# Altium footprint library MOLEX THD.PcbLib: 57 footprints (part 2 of 4)
Each footprint in its own frame and in the unit in brackets; x right, y up, seen from the top. Pads: shape width x height; smd on the part's side, far side on the other; paste and mask are expansions set on the pad; w line width, h text height; cw(c..) or ccw(c..) is an arc to the next point about the centre after c.
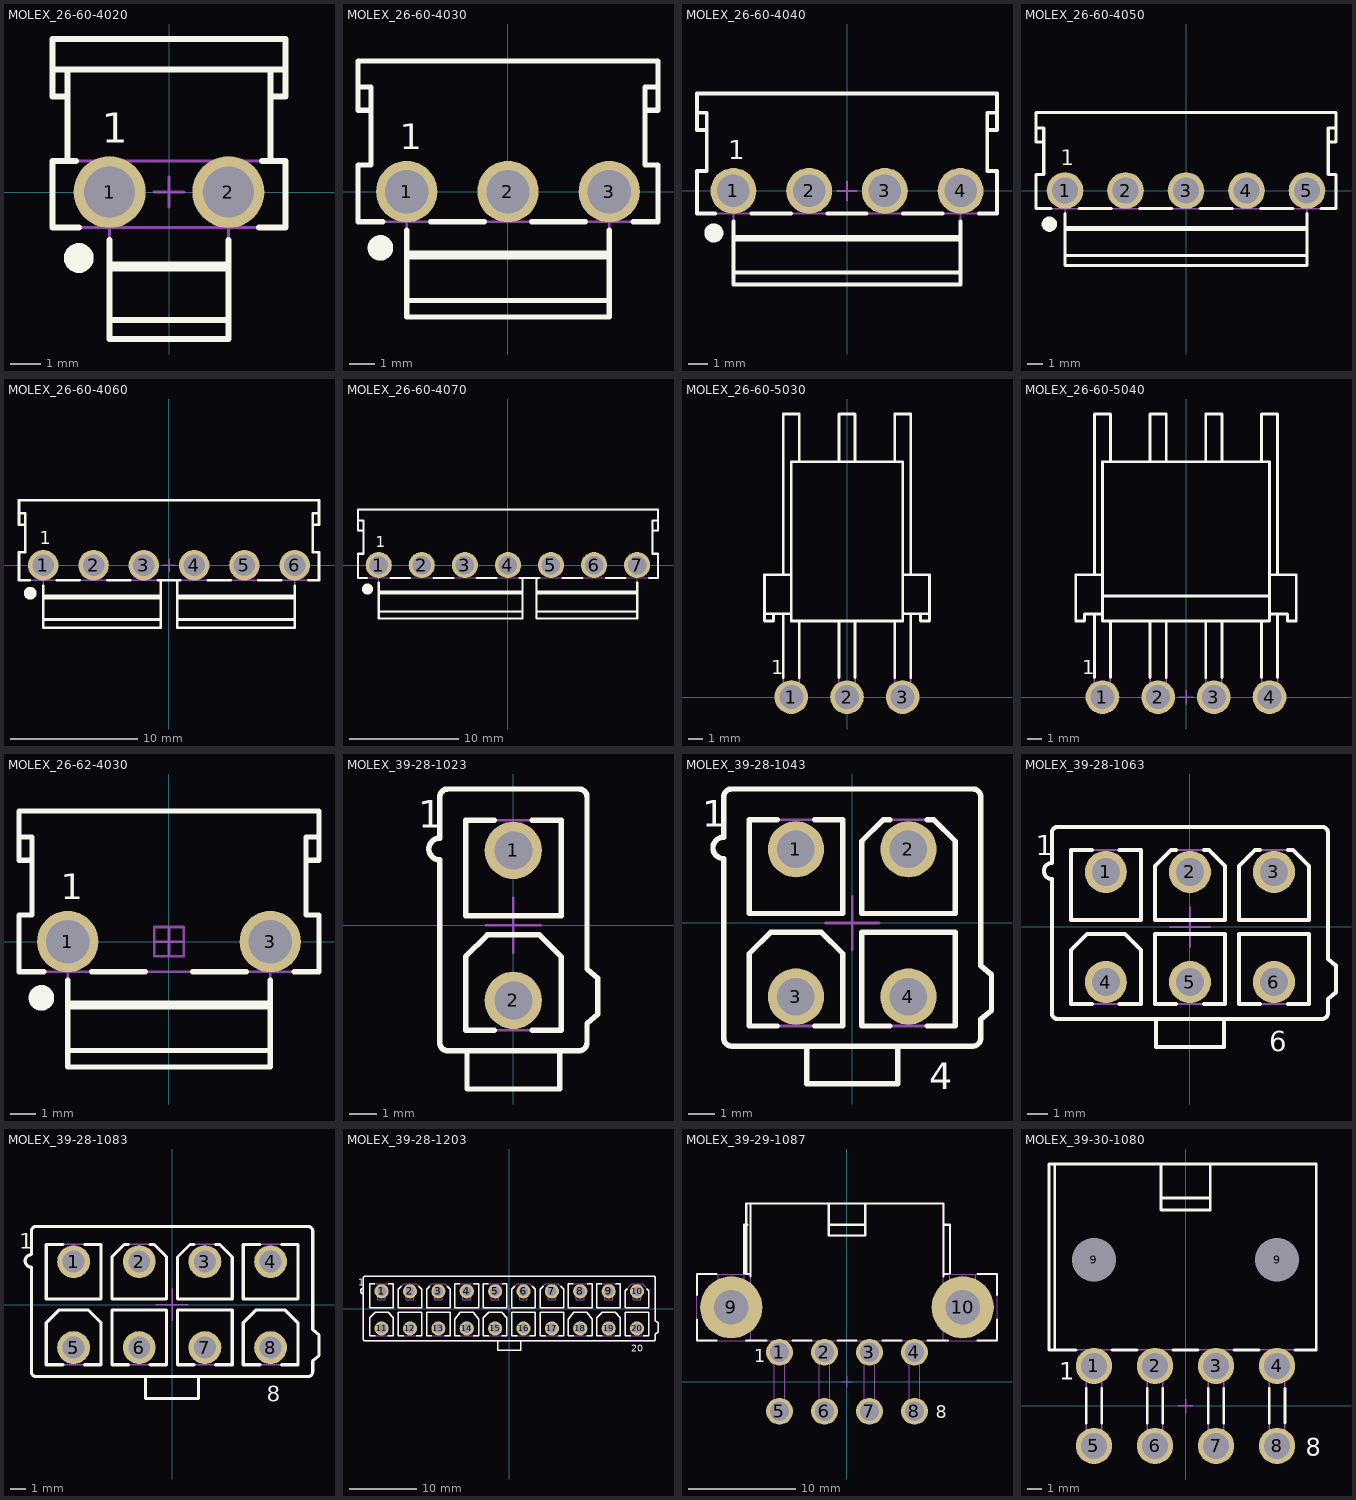
[diagram p1: the footprints below, top view; thin cyan lines are the x and y axes]

## MOLEX_26-60-4020 [mm] "3.96mm (.156\") Pitch KK® Solid Header, Vertical, Friction Lock, 2 Circuits, Tin (Sn) Plating"
height 14.73
pads (2):
  round 2.4 hole 1.7: 1(-1.981,0) 2(1.981,0)
Top Overlay:
  circle w0.5: c-3.011,-2.2 r0.25
  lines w0.2: -3.886,4.089 3.886,4.089 ; -3.378,1.041 -3.378,4.089 ; -3.378,3.182 -3.886,3.182 -3.886,5.105 3.886,5.105 3.886,3.182 3.378,3.182 ; -3.1,1.041 -3.886,1.041 -3.886,-1.181 -3,-1.181 ; -1.981,-4.267 1.981,-4.267 ; -1.981,-2.548 1.981,-2.548 ; -1.981,-2.413 1.981,-2.413 ; -1.981,-1.6 -1.981,-4.902 1.981,-4.902 1.981,-1.6 ; 3,-1.181 3.886,-1.181 3.886,1.041 3.1,1.041 ; 3.378,1.041 3.378,4.089
  text "1" at -2.249,1.65 h1
Mechanical 8:
  lines w0.1: -2.481,0 -1.981,0 ; -1.981,-0.5 -1.981,0 ; -1.981,0.5 -1.981,0 ; -1.481,0 -1.981,0 ; -0.5,0 0,0 ; 0,-0.5 0,0 ; 0,0.5 0,0 ; 0.5,0 0,0 ; 1.481,0 1.981,0 ; 1.981,-0.5 1.981,0 ; 1.981,0.5 1.981,0 ; 2.481,0 1.981,0
Mechanical 14:
  lines w0.1: -3.886,4.089 3.886,4.089 ; -3.378,1.041 -3.378,4.089 ; -3.378,3.182 -3.886,3.182 -3.886,5.105 3.886,5.105 3.886,3.182 3.378,3.182 ; -1.981,-4.267 1.981,-4.267 ; -1.981,-2.548 1.981,-2.548 ; -1.981,-2.413 1.981,-2.413 ; -1.981,-1.181 -1.981,-4.902 1.981,-4.902 1.981,-1.181 ; 2.55,-0.571 2.55,0.571 ; 3.378,1.041 3.378,4.089 ; -3.886,-1.181 -3.886,1.041 3.886,1.041 3.886,-1.181 -3.886,-1.181
  text "1" at -2.249,1.65 h1
3D body "MOLEX_26-60-4020.stp": height 14.73, standoff -3.56, extent -3.886,-4.902 3.886,5.105

## MOLEX_26-60-4030 [mm] "3.96mm (.156\") Pitch KK® Solid Header, Vertical, Friction Lock, 3 Circuits, Tin (Sn) Plating"
height 14.73
pads (3):
  round 2.4 hole 1.7: 1(-3.96,0) 2(0,0) 3(3.96,0)
Top Overlay:
  circle w0.5: c-4.99,-2.2 r0.25
  lines w0.2: -5.864,4.087 -5.356,4.087 -5.356,1.041 -5.864,1.041 -5.864,-1.18 -4.886,-1.18 ; -5.356,3.18 -5.864,3.18 -5.864,5.102 5.864,5.102 5.864,3.18 5.356,3.18 ; -3.96,-4.265 3.96,-4.265 ; -3.96,-2.546 3.96,-2.546 ; -3.96,-2.412 3.96,-2.412 ; -3.96,-1.5 -3.96,-4.899 3.96,-4.899 3.96,-1.5 ; -3.034,-1.18 -0.926,-1.18 ; 0.926,-1.18 3.034,-1.18 ; 4.886,-1.18 5.864,-1.18 5.864,1.041 5.356,1.041 5.356,4.087 5.864,4.087
  text "1" at -4.228,1.65 h1
Mechanical 8:
  lines w0.1: -4.46,0 -3.96,0 ; -3.96,-0.5 -3.96,0 ; -3.96,0.5 -3.96,0 ; -3.46,0 -3.96,0 ; -0.5,0 0,0 ; 0,-0.5 0,0 ; 0,0.5 0,0 ; 0.5,0 0,0 ; 3.46,0 3.96,0 ; 3.96,-0.5 3.96,0 ; 3.96,0.5 3.96,0 ; 4.46,0 3.96,0
Mechanical 14:
  lines w0.1: -5.864,4.087 -5.356,4.087 -5.356,1.041 -5.864,1.041 -5.864,-1.18 5.864,-1.18 5.864,1.041 5.356,1.041 5.356,4.087 5.864,4.087 ; -5.356,3.18 -5.864,3.18 -5.864,5.102 5.864,5.102 5.864,3.18 5.356,3.18 ; -3.96,-4.265 3.96,-4.265 ; -3.96,-2.546 3.96,-2.546 ; -3.96,-2.412 3.96,-2.412 ; -3.96,-1.18 -3.96,-4.899 3.96,-4.899 3.96,-1.18 ; -4.531,-0.571 -3.389,-0.571 -3.389,0.571 -4.531,0.571 -4.531,-0.571 ; -0.571,-0.571 0.571,-0.571 0.571,0.571 -0.571,0.571 -0.571,-0.571 ; 3.389,-0.571 4.531,-0.571 4.531,0.571 3.389,0.571 3.389,-0.571
  text "1" at -4.228,1.65 h1
3D body "MOLEX_26-60-4030.stp": height 14.73, standoff -3.56, extent -5.864,-4.899 5.871,5.108

## MOLEX_26-60-4040 [mm] "3.96mm (.156\") Pitch KK® Solid Header, Vertical, Friction Lock, 4 Circuits, Tin (Sn) Plating"
height 14.73
pads (4):
  round 2.4 hole 1.7: 1(-5.94,0) 2(-1.98,0) 3(1.98,0) 4(5.94,0)
Top Overlay:
  circle w0.5: c-6.97,-2.2 r0.25
  lines w0.2: -7.849,4.089 -7.341,4.089 -7.341,3.181 ; -6.9,-1.181 -7.849,-1.181 -7.849,1.041 -7.341,1.041 -7.341,3.181 ; -5.944,-4.268 5.944,-4.268 ; -5.944,-2.548 5.944,-2.548 ; -5.944,-2.413 5.944,-2.413 ; -5.944,-1.6 -5.944,-4.898 5.944,-4.903 5.944,-1.6 ; -4.989,-1.181 -2.931,-1.181 ; -1.029,-1.181 1.029,-1.181 ; 2.931,-1.181 4.989,-1.181 ; 6.9,-1.181 7.849,-1.181 7.849,1.041 7.341,1.041 7.341,3.181 ; 7.849,4.089 7.341,4.089 7.341,3.181 ; -7.341,3.181 -7.849,3.181 -7.849,5.105 7.849,5.105 7.849,3.181 7.341,3.181
  text "1" at -6.208,1.65 h1
Mechanical 8:
  lines w0.1: -6.44,0 -5.94,0 ; -5.94,-0.5 -5.94,0 ; -5.94,0.5 -5.94,0 ; -5.44,0 -5.94,0 ; -2.48,0 -1.98,0 ; -1.98,-0.5 -1.98,0 ; -1.98,0.5 -1.98,0 ; -1.48,0 -1.98,0 ; -0.5,0 0,0 ; 0,-0.5 0,0 ; 0,0.5 0,0 ; 0.5,0 0,0 ; 1.48,0 1.98,0 ; 1.98,-0.5 1.98,0 ; 1.98,0.5 1.98,0 ; 2.48,0 1.98,0 ; 5.44,0 5.94,0 ; 5.94,-0.5 5.94,0 ; 5.94,0.5 5.94,0 ; 6.44,0 5.94,0
Mechanical 14:
  lines w0.1: -7.849,4.089 -7.341,4.089 -7.341,3.181 ; -5.944,-4.268 5.944,-4.268 ; -5.944,-2.548 5.944,-2.548 ; -5.944,-2.413 5.944,-2.413 ; 7.849,4.089 7.341,4.089 7.341,3.181 ; -7.341,3.181 -7.341,1.041 -7.849,1.041 -7.849,-1.181 -5.944,-1.181 ; -7.341,3.181 -7.849,3.181 -7.849,5.105 7.849,5.105 7.849,3.181 7.341,3.181 ; -5.944,-1.181 -5.944,-4.898 5.944,-4.903 5.944,-1.181 ; -5.944,-1.181 5.944,-1.181 ; 5.944,-1.181 7.849,-1.181 7.849,1.041 7.341,1.041 7.341,3.181
  text "1" at -6.208,1.65 h1
3D body "MOLEX_26-60-4040.stp": height 14.73, standoff -3.54, extent -7.849,-4.902 7.849,5.105

## MOLEX_26-60-4050 [mm] "3.96mm (.156\") Pitch KK® Solid Header, Vertical, Friction Lock, 5 Circuits, Tin (Sn) Plating"
height 14.73
pads (5):
  round 2.4 hole 1.7: 1(-7.92,0) 2(-3.96,0) 3(0,0) 4(3.96,0) 5(7.92,0)
Top Overlay:
  circle w0.5: c-8.95,-2.2 r0.25
  lines w0.2: -9.824,4.087 -9.316,4.087 -9.316,1.041 -9.824,1.041 -9.824,-1.18 -8.846,-1.18 ; -9.316,3.18 -9.824,3.18 -9.824,5.102 9.824,5.102 9.824,3.18 9.316,3.18 ; -7.92,-4.265 7.92,-4.265 ; -7.92,-2.546 7.92,-2.546 ; -7.92,-2.412 7.92,-2.412 ; -7.92,-1.5 -7.92,-4.899 7.92,-4.899 7.92,-1.5 ; -6.994,-1.18 -4.886,-1.18 ; -3.034,-1.18 -0.926,-1.18 ; 0.926,-1.18 3.034,-1.18 ; 4.886,-1.18 6.994,-1.18 ; 8.846,-1.18 9.824,-1.18 9.824,1.041 9.316,1.041 9.316,4.087 9.824,4.087
  text "1" at -8.188,1.65 h1
Mechanical 8:
  lines w0.1: -8.42,0 -7.92,0 ; -7.92,-0.5 -7.92,0 ; -7.92,0.5 -7.92,0 ; -7.42,0 -7.92,0 ; -4.46,0 -3.96,0 ; -3.96,-0.5 -3.96,0 ; -3.96,0.5 -3.96,0 ; -3.46,0 -3.96,0 ; -0.5,0 0,0 ; 0,-0.5 0,0 ; 0,0.5 0,0 ; 0.5,0 0,0 ; 3.46,0 3.96,0 ; 3.96,-0.5 3.96,0 ; 3.96,0.5 3.96,0 ; 4.46,0 3.96,0 ; 7.42,0 7.92,0 ; 7.92,-0.5 7.92,0 ; 7.92,0.5 7.92,0 ; 8.42,0 7.92,0
Mechanical 14:
  lines w0.1: -9.824,4.087 -9.316,4.087 -9.316,1.041 -9.824,1.041 -9.824,-1.18 9.824,-1.18 9.824,1.041 9.316,1.041 9.316,4.087 9.824,4.087 ; -9.316,3.18 -9.824,3.18 -9.824,5.102 9.824,5.102 9.824,3.18 9.316,3.18 ; -7.92,-4.265 7.92,-4.265 ; -7.92,-2.546 7.92,-2.546 ; -7.92,-2.412 7.92,-2.412 ; -7.92,-1.18 -7.92,-4.899 7.92,-4.899 7.92,-1.18 ; -8.491,-0.571 -8.491,0.571 -7.349,0.571 -7.349,-0.571 -8.491,-0.571 ; -4.531,-0.571 -4.531,0.571 -3.389,0.571 -3.389,-0.571 -4.531,-0.571 ; -0.571,-0.571 -0.571,0.571 0.571,0.571 0.571,-0.571 -0.571,-0.571 ; 3.389,-0.571 3.389,0.571 4.531,0.571 4.531,-0.571 3.389,-0.571 ; 7.349,-0.571 7.349,0.571 8.491,0.571 8.491,-0.571 7.349,-0.571
  text "1" at -8.188,1.65 h1
3D body "MOLEX_26-60-4050.stp": height 14.72, standoff -3.55, extent -9.824,-4.899 9.824,5.102

## MOLEX_26-60-4060 [mm] "3.96mm (.156\") Pitch KK® Solid Header, Vertical, Friction Lock, 6 Circuits, Tin (Sn) Plating"
height 14.73
pads (6):
  round 2.4 hole 1.7: 1(-9.9,0) 2(-5.94,0) 3(-1.98,0) 4(1.98,0) 5(5.94,0) 6(9.9,0)
Top Overlay:
  circle w0.5: c-10.93,-2.2 r0.25
  lines w0.2: -11.811,4.089 -11.303,4.089 -11.303,1.041 -11.811,1.041 -11.811,-1.181 -10.979,-1.181 ; -11.303,3.182 -11.811,3.182 -11.811,3.216 -11.811,5.105 11.811,5.105 11.811,3.182 11.303,3.182 ; -9.906,-4.267 -0.635,-4.267 ; -9.906,-2.599 -0.635,-2.599 ; -9.906,-2.413 -0.635,-2.413 ; -9.906,-1.6 -9.906,-4.902 -0.635,-4.902 -0.635,-1.181 ; -8.821,-1.181 -7.019,-1.181 ; -4.861,-1.181 -3.059,-1.181 ; -0.901,-1.181 0.901,-1.181 ; 0.635,-4.267 9.906,-4.267 ; 0.635,-2.599 9.906,-2.599 ; 0.635,-2.413 9.906,-2.413 ; 0.635,-1.181 0.635,-4.902 9.906,-4.902 9.906,-1.6 ; 3.059,-1.181 4.861,-1.181 ; 7.019,-1.181 8.821,-1.181 ; 10.979,-1.181 11.811,-1.181 11.811,1.041 11.303,1.041 11.303,4.089 11.811,4.089
  text "1" at -10.168,1.65 h1
Mechanical 8:
  lines w0.1: -10.4,0 -9.9,0 ; -9.9,-0.5 -9.9,0 ; -9.9,0.5 -9.9,0 ; -9.4,0 -9.9,0 ; -6.44,0 -5.94,0 ; -5.94,-0.5 -5.94,0 ; -5.94,0.5 -5.94,0 ; -5.44,0 -5.94,0 ; -2.48,0 -1.98,0 ; -1.98,-0.5 -1.98,0 ; -1.98,0.5 -1.98,0 ; -1.48,0 -1.98,0 ; -0.5,0 0,0 ; 0,-0.5 0,0 ; 0,0.5 0,0 ; 0.5,0 0,0 ; 1.48,0 1.98,0 ; 1.98,-0.5 1.98,0 ; 1.98,0.5 1.98,0 ; 2.48,0 1.98,0 ; 5.44,0 5.94,0 ; 5.94,-0.5 5.94,0 ; 5.94,0.5 5.94,0 ; 6.44,0 5.94,0 ; 9.4,0 9.9,0 ; 9.9,-0.5 9.9,0 ; 9.9,0.5 9.9,0 ; 10.4,0 9.9,0
Mechanical 14:
  lines w0.1: -11.811,4.089 -11.303,4.089 -11.303,1.041 -11.811,1.041 -11.811,-1.181 11.811,-1.181 11.811,1.041 11.303,1.041 11.303,4.089 11.811,4.089 ; -11.303,3.182 -11.811,3.182 -11.811,3.216 -11.811,5.105 11.811,5.105 11.811,3.182 11.303,3.182 ; -9.906,-4.267 -0.635,-4.267 ; -9.906,-2.599 -0.635,-2.599 ; -9.906,-2.413 -0.635,-2.413 ; -9.906,-1.181 -9.906,-4.902 -0.635,-4.902 -0.635,-1.181 ; 0.635,-4.267 9.906,-4.267 ; 0.635,-2.599 9.906,-2.599 ; 0.635,-2.413 9.906,-2.413 ; 0.635,-1.181 0.635,-4.902 9.906,-4.902 9.906,-1.181 ; -10.477,-0.572 -9.334,-0.572 -9.334,0.572 -10.477,0.572 -10.477,-0.572 ; -6.515,-0.572 -5.372,-0.572 -5.372,0.572 -6.515,0.572 -6.515,-0.572 ; -2.553,-0.572 -1.41,-0.572 -1.41,0.572 -2.553,0.572 -2.553,-0.572 ; 1.41,-0.572 2.553,-0.572 2.553,0.572 1.41,0.572 1.41,-0.572 ; 5.372,-0.572 6.515,-0.572 6.515,0.572 5.372,0.572 5.372,-0.572 ; 9.335,-0.572 10.478,-0.572 10.478,0.572 9.335,0.572 9.335,-0.572
  text "1" at -10.168,1.65 h1
3D body "MOLEX_26-60-4060.stp": height 14.73, standoff -3.56, extent -11.811,-4.902 11.811,5.106

## MOLEX_26-60-4070 [mm] "3.96mm (.156\") Pitch KK® Solid Header, Vertical, Friction Lock, 7 Circuits, Tin (Sn) Plating"
height 14.73
pads (7):
  round 2.4 hole 1.7: 1(-11.887,0) 2(-7.927,0) 3(-3.967,0) 4(-0.007,0) 5(3.953,0) 6(7.913,0) 7(11.875,0)
Top Overlay:
  circle w0.5: c-12.917,-2.2 r0.25
  lines w0.2: -13.792,4.089 -13.284,4.089 -13.284,1.041 -13.792,1.041 -13.792,-1.181 -12.967,-1.181 ; -13.284,3.182 -13.792,3.182 -13.792,5.105 13.792,5.105 13.792,3.182 13.284,3.182 ; -11.887,-4.267 1.346,-4.267 ; -11.887,-2.599 1.346,-2.599 ; -11.887,-2.413 1.346,-2.413 ; -11.887,-1.6 -11.887,-4.902 1.346,-4.902 1.346,-1.181 ; -10.808,-1.181 -9.004,-1.181 ; -6.845,-1.181 -5.042,-1.181 ; -2.883,-1.181 -1.079,-1.181 ; 1.079,-1.181 2.883,-1.181 ; 2.616,-4.267 11.887,-4.267 ; 2.616,-2.599 11.887,-2.599 ; 2.616,-2.413 11.887,-2.413 ; 2.616,-1.181 2.616,-4.902 11.887,-4.902 11.887,-1.6 ; 5.042,-1.181 6.845,-1.181 ; 9.004,-1.181 10.808,-1.181 ; 12.967,-1.181 13.792,-1.181 13.792,1.041 13.284,1.041 13.284,4.089 13.792,4.089
  text "1" at -12.155,1.65 h1
Mechanical 8:
  lines w0.1: -12.387,0 -11.887,0 ; -11.887,-0.5 -11.887,0 ; -11.887,0.5 -11.887,0 ; -11.387,0 -11.887,0 ; -8.425,0 -7.925,0 ; -7.925,-0.5 -7.925,0 ; -7.925,0.5 -7.925,0 ; -7.425,0 -7.925,0 ; -4.462,0 -3.962,0 ; -3.962,-0.5 -3.962,0 ; -3.962,0.5 -3.962,0 ; -3.462,0 -3.962,0 ; -0.5,0 0,0 ; 0,-0.5 0,0 ; 0,0.5 0,0 ; 0.5,0 0,0 ; 3.462,0 3.962,0 ; 3.962,-0.5 3.962,0 ; 3.962,0.5 3.962,0 ; 4.462,0 3.962,0 ; 7.425,0 7.925,0 ; 7.925,-0.5 7.925,0 ; 7.925,0.5 7.925,0 ; 8.425,0 7.925,0 ; 11.387,0 11.887,0 ; 11.887,-0.5 11.887,0 ; 11.887,0.5 11.887,0 ; 12.387,0 11.887,0
Mechanical 14:
  lines w0.1: -13.792,4.089 -13.284,4.089 -13.284,1.041 -13.792,1.041 -13.792,-1.181 13.792,-1.181 13.792,1.041 13.284,1.041 13.284,4.089 13.792,4.089 ; -13.284,3.182 -13.792,3.182 -13.792,5.105 13.792,5.105 13.792,3.182 13.284,3.182 ; -11.887,-4.267 1.346,-4.267 ; -11.887,-2.599 1.346,-2.599 ; -11.887,-2.413 1.346,-2.413 ; -11.887,-1.181 -11.887,-4.902 1.346,-4.902 1.346,-1.181 ; 2.616,-4.267 11.887,-4.267 ; 2.616,-2.599 11.887,-2.599 ; 2.616,-2.413 11.887,-2.413 ; 2.616,-1.181 2.616,-4.902 11.887,-4.902 11.887,-1.181 ; -12.458,-0.571 -11.316,-0.571 -11.316,0.571 -12.458,0.571 -12.458,-0.571 ; -8.498,-0.571 -7.356,-0.571 -7.356,0.571 -8.498,0.571 -8.498,-0.571 ; -4.538,-0.571 -3.396,-0.571 -3.396,0.571 -4.538,0.571 -4.538,-0.571 ; -0.578,-0.571 0.564,-0.571 0.564,0.571 -0.578,0.571 -0.578,-0.571 ; 3.382,-0.571 4.524,-0.571 4.524,0.571 3.382,0.571 3.382,-0.571 ; 7.344,-0.571 7.344,0.571 8.486,0.571 8.486,-0.571 7.344,-0.571 ; 11.294,-0.571 11.294,0.571 12.437,0.571 12.437,-0.571 11.294,-0.571
  text "1" at -12.155,1.65 h1
3D body "MOLEX_26-60-4070.stp": height 14.72, standoff -3.56, extent -13.792,-4.902 13.792,5.105

## MOLEX_26-60-5030 [mm] "3 Circuits, 3.96mm (.156) Pitch KK® Wire-To-Board Right Angle Header With Friction Lock"
height 10.52
pads (3):
  round 2.4 hole 1.7: 1(-3.96,0) 2(0,-0.005) 3(3.96,0)
Top Overlay:
  lines w0.2: -5.867,5.913 -3.962,5.926 ; -5.232,5.913 -5.232,5.405 -5.867,5.405 -5.867,8.707 -3.962,8.707 ; -4.534,1.381 -4.534,5.913 ; -4.534,8.707 -4.534,20.137 -3.391,20.137 -3.391,16.734 ; -3.391,1.383 -3.391,5.405 ; -0.572,1.382 -0.572,5.405 ; -0.572,16.734 -0.572,20.137 0.571,20.137 0.571,16.734 ; 0.571,1.382 0.571,5.405 ; 3.391,1.383 3.391,5.405 ; 3.391,16.734 3.391,20.137 4.534,20.137 4.534,8.707 ; 3.962,5.926 5.867,5.913 ; 3.962,8.707 5.867,8.707 5.867,5.405 5.232,5.405 5.232,5.913 ; 4.534,1.381 4.534,5.913 ; -3.962,5.405 3.962,5.405 3.962,16.734 -3.962,16.734 -3.962,5.405
  text "1" at -5.405,1.615 h1
Mechanical 8:
  lines w0.1: -4.46,-0.005 -3.96,-0.005 ; -3.96,-0.505 -3.96,-0.005 ; -3.96,0.495 -3.96,-0.005 ; -3.46,-0.005 -3.96,-0.005 ; -0.5,-0.005 0,-0.005 ; 0,-0.505 0,-0.005 ; 0,0.495 0,-0.005 ; 0.5,-0.005 0,-0.005 ; 3.46,-0.005 3.96,-0.005 ; 3.96,-0.505 3.96,-0.005 ; 3.96,0.495 3.96,-0.005 ; 4.46,-0.005 3.96,-0.005
Mechanical 14:
  lines w0.1: -5.867,5.913 -3.962,5.926 ; -5.232,5.913 -5.232,5.405 -5.867,5.405 -5.867,8.707 -3.962,8.707 ; -4.534,5.913 -4.534,-0.576 -3.391,-0.576 -3.391,5.405 ; -4.534,8.707 -4.534,20.137 -3.391,20.137 -3.391,16.734 ; -0.572,5.405 -0.572,-0.576 0.571,-0.576 0.571,5.405 ; -0.572,16.734 -0.572,20.137 0.571,20.137 0.571,16.734 ; 3.391,5.405 3.391,-0.576 4.534,-0.576 4.534,5.913 ; 3.391,16.734 3.391,20.137 4.534,20.137 4.534,8.707 ; 3.962,5.926 5.867,5.913 ; 3.962,8.707 5.867,8.707 5.867,5.405 5.232,5.405 5.232,5.913 ; -3.962,5.405 3.962,5.405 3.962,16.734 -3.962,16.734 -3.962,5.405
  text "1" at -5.405,1.615 h1
3D body "MOLEX_26-60-5030.stp": height 10.01, standoff -3.96, extent -5.867,-0.576 5.867,20.137

## MOLEX_26-60-5040 [mm] "3.96mm (.156\") Pitch KK® Solid Header,Right Angle, 4 Circuits, Tin (Sn) Plating"
height 9
pads (4):
  round 2.4 hole 1.7: 1(-5.944,0) 2(-1.981,0) 3(1.981,0) 4(5.944,0)
Top Overlay:
  lines w0.2: -6.515,1.387 -6.515,5.918 ; -6.515,8.712 -6.515,20.142 -5.372,20.142 -5.372,16.739 ; -5.944,5.918 -7.214,5.918 -7.214,5.41 -7.849,5.41 -7.849,8.712 -5.944,8.712 ; -5.944,7.188 5.944,7.188 ; -5.372,1.387 -5.372,5.41 ; -2.553,1.387 -2.553,5.41 ; -2.553,16.739 -2.553,20.142 -1.41,20.142 -1.41,16.739 ; -1.41,1.387 -1.41,5.41 ; 1.41,1.387 1.41,5.41 ; 1.41,16.739 1.41,20.142 2.553,20.142 2.553,16.739 ; 2.553,1.387 2.553,5.41 ; 5.372,1.387 5.372,5.41 ; 5.372,16.739 5.372,20.142 6.515,20.142 6.515,8.712 ; 5.944,5.918 7.214,5.918 7.214,5.41 7.849,5.41 7.849,8.712 5.944,8.712 ; 6.515,1.387 6.515,5.918 ; -5.944,5.41 -5.944,16.739 5.944,16.739 5.944,5.41 -5.944,5.41
  text "1" at -7.388,1.62 h1
Mechanical 8:
  lines w0.1: -6.444,0 -5.944,0 ; -5.944,-0.5 -5.944,0 ; -5.944,0.5 -5.944,0 ; -5.444,0 -5.944,0 ; -2.481,0 -1.981,0 ; -1.981,-0.5 -1.981,0 ; -1.981,0.5 -1.981,0 ; -1.481,0 -1.981,0 ; -0.5,0 0,0 ; 0,-0.5 0,0 ; 0,0.5 0,0 ; 0.5,0 0,0 ; 1.481,0 1.981,0 ; 1.981,-0.5 1.981,0 ; 1.981,0.5 1.981,0 ; 2.481,0 1.981,0 ; 5.444,0 5.944,0 ; 5.944,-0.5 5.944,0 ; 5.944,0.5 5.944,0 ; 6.444,0 5.944,0
Mechanical 14:
  lines w0.1: -6.515,5.918 -6.515,-0.572 ; -6.515,8.712 -6.515,20.142 -5.372,20.142 -5.372,16.739 ; -5.944,5.918 -7.214,5.918 -7.214,5.41 -7.849,5.41 -7.849,8.712 -5.944,8.712 ; -5.944,7.188 5.944,7.188 ; -5.372,5.41 -5.372,-0.572 ; -2.553,5.41 -2.553,-0.572 -1.41,-0.572 -1.41,5.41 ; -2.553,16.739 -2.553,20.142 -1.41,20.142 -1.41,16.739 ; 1.41,5.41 1.41,-0.572 2.553,-0.572 2.553,5.41 ; 1.41,16.739 1.41,20.142 2.553,20.142 2.553,16.739 ; 5.372,5.41 5.372,-0.572 6.515,-0.572 6.515,5.918 ; 5.372,16.739 5.372,20.142 6.515,20.142 6.515,8.712 ; 5.944,5.918 7.214,5.918 7.214,5.41 7.849,5.41 7.849,8.712 5.944,8.712 ; -6.515,-0.572 -5.372,-0.572 ; -6.515,-0.572 -5.372,-0.572 ; -5.944,5.41 -5.944,16.739 5.944,16.739 5.944,5.41 -5.944,5.41
  text "1" at -7.388,1.62 h1
3D body "MOLEX_26-60-5040.stp": height 10.01, standoff -3.96, extent -7.849,-0.571 7.849,20.142

## MOLEX_26-62-4030 [mm] "3.96mm (.156\") Pitch KK® Solid Header, Vertical, Friction Lock, 3 Circuits Without Contact Number 2, Tin (Sn) Plating"
height 14.73
pads (2):
  round 2.4 hole 1.7: 1(-3.96,0) 3(3.96,0)
Top Overlay:
  circle w0.5: c-4.99,-2.2 r0.25
  lines w0.2: -5.864,4.087 -5.356,4.087 -5.356,1.041 -5.864,1.041 -5.864,-1.18 -4.886,-1.18 ; -5.356,3.18 -5.864,3.18 -5.864,5.102 5.864,5.102 5.864,3.18 5.356,3.18 ; -3.96,-4.265 3.96,-4.265 ; -3.96,-2.546 3.96,-2.546 ; -3.96,-2.412 3.96,-2.412 ; -3.96,-1.5 -3.96,-4.899 3.96,-4.899 3.96,-1.5 ; -3.034,-1.18 -0.926,-1.18 ; 0.926,-1.18 3.034,-1.18 ; 4.886,-1.18 5.864,-1.18 5.864,1.041 5.356,1.041 5.356,4.087 5.864,4.087
  text "1" at -4.228,1.65 h1
Mechanical 8:
  lines w0.1: -4.46,0 -3.96,0 ; -3.96,-0.5 -3.96,0 ; -3.96,0.5 -3.96,0 ; -3.46,0 -3.96,0 ; -0.5,0 0,0 ; 0,-0.5 0,0 ; 0,0.5 0,0 ; 0.5,0 0,0 ; 3.46,0 3.96,0 ; 3.96,-0.5 3.96,0 ; 3.96,0.5 3.96,0 ; 4.46,0 3.96,0
Mechanical 14:
  lines w0.1: -5.864,4.087 -5.356,4.087 -5.356,1.041 -5.864,1.041 -5.864,-1.18 5.864,-1.18 5.864,1.041 5.356,1.041 5.356,4.087 5.864,4.087 ; -5.356,3.18 -5.864,3.18 -5.864,5.102 5.864,5.102 5.864,3.18 5.356,3.18 ; -3.96,-4.265 3.96,-4.265 ; -3.96,-2.546 3.96,-2.546 ; -3.96,-2.412 3.96,-2.412 ; -3.96,-1.18 -3.96,-4.899 3.96,-4.899 3.96,-1.18 ; -4.531,-0.571 -3.389,-0.571 -3.389,0.571 -4.531,0.571 -4.531,-0.571 ; -0.571,-0.571 0.571,-0.571 0.571,0.571 -0.571,0.571 -0.571,-0.571 ; 3.389,-0.571 4.531,-0.571 4.531,0.571 3.389,0.571 3.389,-0.571
  text "1" at -4.228,1.65 h1
3D body "MOLEX_26-62-4030.stp": height 14.22, standoff -4.06, extent -5.867,-4.902 5.868,5.106

## MOLEX_39-28-1023 [mm] "4.20mm (.165\") Pitch Mini-Fit Jr. Header, Dual Row, Vertical, without Snap-in Plastic Peg PCB Lock, 2 Circuits"
height 12.8
pads (2):
  round 2.1 hole 1.4: 1(0,2.75) 2(0,-2.75)
Top Overlay:
  lines w0.2: -1.7,-4.6 -1.7,-6 1.7,-6 1.7,-4.6 ; -0.693,-3.85 -1.75,-3.85 -1.75,-1.15 ; -0.693,3.85 -1.75,3.85 -1.75,0.35 1.75,0.35 1.75,3.85 0.693,3.85 ; 0.693,-3.85 1.75,-3.85 1.75,-1.15 0.95,-0.35 -0.95,-0.35 ; -1.75,-1.15 -0.95,-0.35 ; -1.75,-1.15 -0.95,-0.35 ; -2.7,-4.3 ccw(c-2.4,-4.3) -2.4,-4.6 2.4,-4.6 ccw(c2.4,-4.3) 2.7,-4.3 2.7,-3.6 3.1,-3.264 3.1,-1.936 2.7,-1.6 2.7,4.7 ccw(c2.4,4.7) 2.4,5 -2.4,5 ccw(c-2.4,4.7) -2.7,4.7 -2.7,3.2 ccw(c-2.7,2.8) -2.7,2.4 -2.7,-4.3
  text "1" at -3.492,3.582 h1
Mechanical 8:
  lines w0.1: -1,-2.75 0,-2.75 ; -1,0 0,0 ; -1,2.75 0,2.75 ; 0,-3.75 0,-2.75 ; 0,-1.75 0,-2.75 ; 0,-1 0,0 ; 0,1 0,0 ; 0,1.75 0,2.75 ; 0,3.75 0,2.75 ; 1,-2.75 0,-2.75 ; 1,0 0,0 ; 1,2.75 0,2.75
Mechanical 14:
  lines w0.1: -1.7,-4.6 -1.7,-6 1.7,-6 1.7,-4.6 ; -1.75,-1.15 -0.95,-0.35 ; -1.75,-1.15 -1.75,-3.85 1.75,-3.85 1.75,-1.15 0.95,-0.35 -0.95,-0.35 ; -1.75,-1.15 -0.95,-0.35 ; -2.7,-4.3 ccw(c-2.4,-4.3) -2.4,-4.6 2.4,-4.6 ccw(c2.4,-4.3) 2.7,-4.3 2.7,-3.6 3.1,-3.264 3.1,-1.936 2.7,-1.6 2.7,4.7 ccw(c2.4,4.7) 2.4,5 -2.4,5 ccw(c-2.4,4.7) -2.7,4.7 -2.7,3.2 ccw(c-2.7,2.8) -2.7,2.4 -2.7,-4.3 ; -1.75,0.35 1.75,0.35 1.75,3.85 -1.75,3.85 -1.75,0.35
  text "1" at -3.492,3.582 h1
3D body "MOLEX_39-28-1023.stp": height 12.8, standoff -3.5, extent -3.1,-6 3.1,5

## MOLEX_39-28-1043 [mm] "4.20mm (.165\") Pitch Mini-Fit Jr. Header, Dual Row, Vertical, without Snap-in Plastic Peg PCB Lock, 4 Circuits"
height 12.8
pads (4):
  round 2.1 hole 1.4: 1(-2.1,2.75) 2(2.1,2.75) 3(-2.1,-2.75) 4(2.1,-2.75)
Top Overlay:
  lines w0.2: -2.793,-3.85 -3.85,-3.85 -3.85,-1.15 ; -2.793,3.85 -3.85,3.85 -3.85,0.35 -0.35,0.35 -0.35,3.85 -1.407,3.85 ; -1.7,-4.6 -1.7,-6 1.7,-6 1.7,-4.6 ; -1.407,-3.85 -0.35,-3.85 -0.35,-1.15 -1.15,-0.35 -3.05,-0.35 ; 1.407,-3.85 0.35,-3.85 0.35,-0.35 3.85,-0.35 3.85,-3.85 2.793,-3.85 ; 1.407,3.85 1.15,3.85 ; 2.793,3.85 3.05,3.85 3.85,3.05 3.85,0.35 0.35,0.35 0.35,3.05 ; -3.85,-1.15 -3.05,-0.35 ; -3.85,-1.15 -3.05,-0.35 ; 0.35,3.05 1.15,3.85 ; 0.35,3.05 1.15,3.85 ; -4.8,-4.3 ccw(c-4.5,-4.3) -4.5,-4.6 4.5,-4.6 ccw(c4.5,-4.3) 4.8,-4.3 4.8,-3.6 5.2,-3.264 5.2,-1.936 4.8,-1.6 4.8,4.7 ccw(c4.5,4.7) 4.5,5 -4.5,5 ccw(c-4.5,4.7) -4.8,4.7 -4.8,3.2 ccw(c-4.8,2.8) -4.8,2.4 -4.8,-4.3
  text "4" at 2.867,-6.2 h1
  text "1" at -5.592,3.582 h1
Mechanical 8:
  lines w0.1: -3.1,-2.75 -2.1,-2.75 ; -3.1,2.75 -2.1,2.75 ; -2.1,-3.75 -2.1,-2.75 ; -2.1,-1.75 -2.1,-2.75 ; -2.1,1.75 -2.1,2.75 ; -2.1,3.75 -2.1,2.75 ; -1.1,-2.75 -2.1,-2.75 ; -1.1,2.75 -2.1,2.75 ; -1,0 0,0 ; 0,-1 0,0 ; 0,1 0,0 ; 1,0 0,0 ; 1.1,-2.75 2.1,-2.75 ; 1.1,2.75 2.1,2.75 ; 2.1,-3.75 2.1,-2.75 ; 2.1,-1.75 2.1,-2.75 ; 2.1,1.75 2.1,2.75 ; 2.1,3.75 2.1,2.75 ; 3.1,-2.75 2.1,-2.75 ; 3.1,2.75 2.1,2.75
Mechanical 14:
  lines w0.1: -1.7,-4.6 -1.7,-6 1.7,-6 1.7,-4.6 ; -3.85,-1.15 -3.05,-0.35 ; -3.85,-1.15 -3.85,-3.85 -0.35,-3.85 -0.35,-1.15 -1.15,-0.35 -3.05,-0.35 ; -3.85,-1.15 -3.05,-0.35 ; 0.35,3.05 1.15,3.85 ; 0.35,3.05 0.35,0.35 3.85,0.35 3.85,3.05 3.05,3.85 1.15,3.85 ; 0.35,3.05 1.15,3.85 ; -4.8,-4.3 ccw(c-4.5,-4.3) -4.5,-4.6 4.5,-4.6 ccw(c4.5,-4.3) 4.8,-4.3 4.8,-3.6 5.2,-3.264 5.2,-1.936 4.8,-1.6 4.8,4.7 ccw(c4.5,4.7) 4.5,5 -4.5,5 ccw(c-4.5,4.7) -4.8,4.7 -4.8,3.2 ccw(c-4.8,2.8) -4.8,2.4 -4.8,-4.3 ; -3.85,0.35 -0.35,0.35 -0.35,3.85 -3.85,3.85 -3.85,0.35 ; 0.35,-3.85 3.85,-3.85 3.85,-0.35 0.35,-0.35 0.35,-3.85
  text "4" at 2.867,-6.2 h1
  text "1" at -5.592,3.582 h1
3D body "MOLEX_39-28-1043.stp": height 12.8, standoff -3.5, extent -5.2,-6 5.2,5

## MOLEX_39-28-1063 [mm] "4.20mm (.165\") Pitch Mini-Fit Jr. Header, Dual Row, Vertical, without Snap-in Plastic Peg PCB Lock, 6 Circuits"
height 12.8
pads (6):
  round 2.1 hole 1.4: 1(-4.2,2.75) 2(0,2.75) 3(4.2,2.75) 4(-4.2,-2.75) 5(0,-2.75) 6(4.2,-2.75)
Top Overlay:
  lines w0.2: -4.893,-3.85 -5.95,-3.85 -5.95,-1.15 -5.15,-0.35 -3.25,-0.35 -2.45,-1.15 -2.45,-3.85 -3.507,-3.85 ; -4.893,3.85 -5.95,3.85 -5.95,0.35 -2.45,0.35 -2.45,3.85 -3.507,3.85 ; -1.7,-4.6 -1.7,-6 1.7,-6 1.7,-4.6 ; -0.693,-3.85 -1.75,-3.85 -1.75,-0.35 1.75,-0.35 1.75,-3.85 0.693,-3.85 ; -0.693,3.85 -0.95,3.85 -1.75,3.05 -1.75,0.35 1.75,0.35 1.75,3.05 0.95,3.85 0.693,3.85 ; 3.507,-3.85 2.45,-3.85 2.45,-0.35 5.95,-0.35 5.95,-3.85 4.893,-3.85 ; 3.507,3.85 3.25,3.85 2.45,3.05 2.45,0.35 5.95,0.35 5.95,3.05 5.15,3.85 4.893,3.85 ; -6.9,-4.3 ccw(c-6.6,-4.3) -6.6,-4.6 6.6,-4.6 ccw(c6.6,-4.3) 6.9,-4.3 6.9,-3.6 7.3,-3.264 7.3,-1.936 6.9,-1.6 6.9,4.7 ccw(c6.6,4.7) 6.6,5 -6.6,5 ccw(c-6.6,4.7) -6.9,4.7 -6.9,3.2 ccw(c-6.9,2.8) -6.9,2.4 -6.9,-4.3
  text "1" at -7.692,3.582 h1
  text "6" at 3.967,-6.2 h1
Mechanical 8:
  lines w0.1: -5.2,-2.75 -4.2,-2.75 ; -5.2,2.75 -4.2,2.75 ; -4.2,-3.75 -4.2,-2.75 ; -4.2,-1.75 -4.2,-2.75 ; -4.2,1.75 -4.2,2.75 ; -4.2,3.75 -4.2,2.75 ; -3.2,-2.75 -4.2,-2.75 ; -3.2,2.75 -4.2,2.75 ; -1,-2.75 0,-2.75 ; -1,0 0,0 ; -1,2.75 0,2.75 ; 0,-3.75 0,-2.75 ; 0,-1.75 0,-2.75 ; 0,-1 0,0 ; 0,1 0,0 ; 0,1.75 0,2.75 ; 0,3.75 0,2.75 ; 1,-2.75 0,-2.75 ; 1,0 0,0 ; 1,2.75 0,2.75 ; 3.2,-2.75 4.2,-2.75 ; 3.2,2.75 4.2,2.75 ; 4.2,-3.75 4.2,-2.75 ; 4.2,-1.75 4.2,-2.75 ; 4.2,1.75 4.2,2.75 ; 4.2,3.75 4.2,2.75 ; 5.2,-2.75 4.2,-2.75 ; 5.2,2.75 4.2,2.75
Mechanical 14:
  lines w0.1: -1.7,-4.6 -1.7,-6 1.7,-6 1.7,-4.6 ; -6.9,-4.3 ccw(c-6.6,-4.3) -6.6,-4.6 6.6,-4.6 ccw(c6.6,-4.3) 6.9,-4.3 6.9,-3.6 7.3,-3.264 7.3,-1.936 6.9,-1.6 6.9,4.7 ccw(c6.6,4.7) 6.6,5 -6.6,5 ccw(c-6.6,4.7) -6.9,4.7 -6.9,3.2 ccw(c-6.9,2.8) -6.9,2.4 -6.9,-4.3 ; -5.95,-3.85 -5.95,-1.15 -5.15,-0.35 -3.25,-0.35 -2.45,-1.15 -2.45,-3.85 -5.95,-3.85 ; -5.95,0.35 -5.95,3.85 -2.45,3.85 -2.45,0.35 -5.95,0.35 ; -1.75,-3.85 -1.75,-0.35 1.75,-0.35 1.75,-3.85 -1.75,-3.85 ; -1.75,0.35 -1.75,3.05 -0.95,3.85 0.95,3.85 1.75,3.05 1.75,0.35 -1.75,0.35 ; 2.45,-3.85 2.45,-0.35 5.95,-0.35 5.95,-3.85 2.45,-3.85 ; 2.45,0.35 2.45,3.05 3.25,3.85 5.15,3.85 5.95,3.05 5.95,0.35 2.45,0.35
  text "1" at -7.692,3.582 h1
  text "6" at 3.967,-6.2 h1
3D body "MOLEX_39-28-1063.stp": height 12.8, standoff -3.5, extent -7.3,-6 7.3,5

## MOLEX_39-28-1083 [mm] "4.20mm (.165\") Pitch Mini-Fit Jr. Header, Dual Row, Vertical, without Snap-in Plastic Peg PCB Lock, 8 Circuits"
height 12.8
pads (8):
  round 2.1 hole 1.4: 1(-6.3,2.75) 2(-2.1,2.75) 3(2.1,2.75) 4(6.3,2.75) 5(-6.3,-2.75) 6(-2.1,-2.75) 7(2.1,-2.75) 8(6.3,-2.75)
Top Overlay:
  lines w0.2: -6.993,-3.85 -8.05,-3.85 -8.05,-1.15 -7.25,-0.35 -5.35,-0.35 -4.55,-1.15 -4.55,-3.85 -5.607,-3.85 ; -6.993,3.85 -8.05,3.85 -8.05,0.35 -4.55,0.35 -4.55,3.85 -5.607,3.85 ; -2.793,-3.85 -3.85,-3.85 -3.85,-0.35 -0.35,-0.35 -0.35,-3.85 -1.407,-3.85 ; -2.793,3.85 -3.05,3.85 -3.85,3.05 -3.85,0.35 -0.35,0.35 -0.35,3.05 -1.15,3.85 -1.407,3.85 ; -1.7,-4.6 -1.7,-6 1.7,-6 1.7,-4.6 ; 1.407,-3.85 0.35,-3.85 0.35,-0.35 3.85,-0.35 3.85,-3.85 2.793,-3.85 ; 1.407,3.85 1.15,3.85 0.35,3.05 0.35,0.35 3.85,0.35 3.85,3.05 3.05,3.85 2.793,3.85 ; 5.607,-3.85 4.55,-3.85 4.55,-1.15 5.35,-0.35 7.25,-0.35 8.05,-1.15 8.05,-3.85 6.993,-3.85 ; 5.607,3.85 4.55,3.85 4.55,0.35 8.05,0.35 8.05,3.85 6.993,3.85 ; -9,-4.3 ccw(c-8.7,-4.3) -8.7,-4.6 8.7,-4.6 ccw(c8.7,-4.3) 9,-4.3 9,-3.6 9.4,-3.264 9.4,-1.936 9,-1.6 9,4.7 ccw(c8.7,4.7) 8.7,5 -8.7,5 ccw(c-8.7,4.7) -9,4.7 -9,3.2 ccw(c-9,2.8) -9,2.4 -9,-4.3
  text "8" at 6.067,-6.2 h1
  text "1" at -9.792,3.582 h1
Mechanical 8:
  lines w0.1: -7.3,-2.75 -6.3,-2.75 ; -7.3,2.75 -6.3,2.75 ; -6.3,-3.75 -6.3,-2.75 ; -6.3,-1.75 -6.3,-2.75 ; -6.3,1.75 -6.3,2.75 ; -6.3,3.75 -6.3,2.75 ; -5.3,-2.75 -6.3,-2.75 ; -5.3,2.75 -6.3,2.75 ; -3.1,-2.75 -2.1,-2.75 ; -3.1,2.75 -2.1,2.75 ; -2.1,-3.75 -2.1,-2.75 ; -2.1,-1.75 -2.1,-2.75 ; -2.1,1.75 -2.1,2.75 ; -2.1,3.75 -2.1,2.75 ; -1.1,-2.75 -2.1,-2.75 ; -1.1,2.75 -2.1,2.75 ; -1,0 0,0 ; 0,-1 0,0 ; 0,1 0,0 ; 1,0 0,0 ; 1.1,-2.75 2.1,-2.75 ; 1.1,2.75 2.1,2.75 ; 2.1,-3.75 2.1,-2.75 ; 2.1,-1.75 2.1,-2.75 ; 2.1,1.75 2.1,2.75 ; 2.1,3.75 2.1,2.75 ; 3.1,-2.75 2.1,-2.75 ; 3.1,2.75 2.1,2.75 ; 5.3,-2.75 6.3,-2.75 ; 5.3,2.75 6.3,2.75 ; 6.3,-3.75 6.3,-2.75 ; 6.3,-1.75 6.3,-2.75 ; 6.3,1.75 6.3,2.75 ; 6.3,3.75 6.3,2.75 ; 7.3,-2.75 6.3,-2.75 ; 7.3,2.75 6.3,2.75
Mechanical 14:
  lines w0.1: -1.7,-4.6 -1.7,-6 1.7,-6 1.7,-4.6 ; -9,-4.3 ccw(c-8.7,-4.3) -8.7,-4.6 8.7,-4.6 ccw(c8.7,-4.3) 9,-4.3 9,-3.6 9.4,-3.264 9.4,-1.936 9,-1.6 9,4.7 ccw(c8.7,4.7) 8.7,5 -8.7,5 ccw(c-8.7,4.7) -9,4.7 -9,3.2 ccw(c-9,2.8) -9,2.4 -9,-4.3 ; -8.05,-3.85 -8.05,-1.15 -7.25,-0.35 -5.35,-0.35 -4.55,-1.15 -4.55,-3.85 -8.05,-3.85 ; -8.05,0.35 -8.05,3.85 -4.55,3.85 -4.55,0.35 -8.05,0.35 ; -3.85,-3.85 -3.85,-0.35 -0.35,-0.35 -0.35,-3.85 -3.85,-3.85 ; -3.85,0.35 -3.85,3.05 -3.05,3.85 -1.15,3.85 -0.35,3.05 -0.35,0.35 -3.85,0.35 ; 0.35,-3.85 0.35,-0.35 3.85,-0.35 3.85,-3.85 0.35,-3.85 ; 0.35,0.35 0.35,3.05 1.15,3.85 3.05,3.85 3.85,3.05 3.85,0.35 0.35,0.35 ; 4.55,-3.85 4.55,-1.15 5.35,-0.35 7.25,-0.35 8.05,-1.15 8.05,-3.85 4.55,-3.85 ; 4.55,0.35 4.55,3.85 8.05,3.85 8.05,0.35 4.55,0.35
  text "8" at 6.067,-6.2 h1
  text "1" at -9.792,3.582 h1
3D body "MOLEX_39-28-1083.stp": height 12.8, standoff -3.5, extent -9.4,-6 9.4,5

## MOLEX_39-28-1203 [mm] "4.20mm (.165\") Pitch Mini-Fit Jr. Header, Dual Row, Vertical, without Snap-in Plastic Peg PCB Lock, 20 Circuits"
height 13.1
pads (20):
  round 2.1 hole 1.4: 1(-18.9,2.55) 2(-14.7,2.55) 3(-10.5,2.55) 4(-6.3,2.55) 5(-2.1,2.55) 6(2.1,2.55) 7(6.3,2.55) 8(10.5,2.55) 9(14.7,2.55) 10(18.9,2.55) 11(-18.9,-2.95) 12(-14.7,-2.95) 13(-10.5,-2.95) 14(-6.3,-2.95) 15(-2.1,-2.95) 16(2.1,-2.95) 17(6.3,-2.95) 18(10.5,-2.95) 19(14.7,-2.95) 20(18.9,-2.95)
Top Overlay:
  lines w0.2: -21.6,2.2 cw(c-21.6,2.6) -21.6,3 ; -19.92,3.65 -20.65,3.65 -20.65,0.15 -17.15,0.15 -17.15,3.65 -17.88,3.65 ; -19.845,-4.05 -20.65,-4.05 -20.65,-1.35 -19.85,-0.55 -17.95,-0.55 -17.15,-1.35 -17.15,-4.05 -17.955,-4.05 ; -15.998,3.302 -16.45,2.85 -16.45,0.15 -12.95,0.15 -12.95,2.85 -13.402,3.302 ; -15.645,-4.05 -16.45,-4.05 -16.45,-0.55 -12.95,-0.55 -12.95,-4.05 -13.755,-4.05 ; -11.798,3.302 -12.25,2.85 -12.25,0.15 -8.75,0.15 -8.75,2.85 -9.202,3.302 ; -11.445,-4.05 -12.25,-4.05 -12.25,-0.55 -8.75,-0.55 -8.75,-4.05 -9.555,-4.05 ; -7.32,3.65 -8.05,3.65 -8.05,0.15 -4.55,0.15 -4.55,3.65 -5.28,3.65 ; -7.245,-4.05 -8.05,-4.05 -8.05,-1.55 -7.25,-0.55 -5.35,-0.55 -4.55,-1.55 -4.55,-4.05 -5.355,-4.05 ; -3.12,3.65 -3.85,3.65 -3.85,0.15 -0.35,0.15 -0.35,3.65 -1.08,3.65 ; -3.045,-4.05 -3.85,-4.05 -3.85,-1.35 -3.05,-0.55 -1.15,-0.55 -0.35,-1.35 -0.35,-4.05 -1.155,-4.05 ; -1.7,-4.8 -1.7,-6.2 1.7,-6.2 1.7,-4.8 ; 0.802,3.302 0.35,2.85 0.35,0.15 3.85,0.15 3.85,2.85 3.398,3.302 ; 1.155,-4.05 0.35,-4.05 0.35,-0.55 3.85,-0.55 3.85,-4.05 3.045,-4.05 ; 5.002,3.302 4.55,2.85 4.55,0.15 8.05,0.15 8.05,2.85 7.598,3.302 ; 5.355,-4.05 4.55,-4.05 4.55,-0.55 8.05,-0.55 8.05,-4.05 7.245,-4.05 ; 9.48,3.65 8.75,3.65 8.75,0.15 12.25,0.15 12.25,3.65 11.52,3.65 ; 9.555,-4.05 8.75,-4.05 8.75,-1.55 9.55,-0.55 11.45,-0.55 12.25,-1.55 12.25,-4.05 11.445,-4.05 ; 13.68,3.65 12.95,3.65 12.95,0.15 16.45,0.15 16.45,3.65 15.72,3.65 ; 13.755,-4.05 12.95,-4.05 12.95,-1.35 13.75,-0.55 15.65,-0.55 16.45,-1.35 16.45,-4.05 15.645,-4.05 ; 17.456,2.956 17.15,2.65 17.15,0.15 20.65,0.15 20.65,2.65 20.344,2.956 ; 17.955,-4.05 17.15,-4.05 17.15,-0.55 20.65,-0.55 20.65,-4.05 19.845,-4.05 ; -21.6,-4.5 ccw(c-21.3,-4.5) -21.3,-4.8 21.3,-4.8 ccw(c21.3,-4.5) 21.6,-4.5 21.6,-3.8 22,-3.464 22,-2.136 21.6,-1.8 21.6,4.5 ccw(c21.3,4.5) 21.3,4.8 -21.3,4.8 ccw(c-21.3,4.5) -21.6,4.5 -21.6,-4.5
  text "1" at -22.392,3.382 h1
  text "20" at 18.033,-6.418 h1
Mechanical 8:
  lines w0.1: -19.4,-2.95 -18.9,-2.95 ; -19.4,2.55 -18.9,2.55 ; -18.9,-3.45 -18.9,-2.95 ; -18.9,-2.45 -18.9,-2.95 ; -18.9,2.05 -18.9,2.55 ; -18.9,3.05 -18.9,2.55 ; -18.4,-2.95 -18.9,-2.95 ; -18.4,2.55 -18.9,2.55 ; -15.2,-2.95 -14.7,-2.95 ; -15.2,2.55 -14.7,2.55 ; -14.7,-3.45 -14.7,-2.95 ; -14.7,-2.45 -14.7,-2.95 ; -14.7,2.05 -14.7,2.55 ; -14.7,3.05 -14.7,2.55 ; -14.2,-2.95 -14.7,-2.95 ; -14.2,2.55 -14.7,2.55 ; -11,-2.95 -10.5,-2.95 ; -11,2.55 -10.5,2.55 ; -10.5,-3.45 -10.5,-2.95 ; -10.5,-2.45 -10.5,-2.95 ; -10.5,2.05 -10.5,2.55 ; -10.5,3.05 -10.5,2.55 ; -10,-2.95 -10.5,-2.95 ; -10,2.55 -10.5,2.55 ; -6.8,-2.95 -6.3,-2.95 ; -6.8,2.55 -6.3,2.55 ; -6.3,-3.45 -6.3,-2.95 ; -6.3,-2.45 -6.3,-2.95 ; -6.3,2.05 -6.3,2.55 ; -6.3,3.05 -6.3,2.55 ; -5.8,-2.95 -6.3,-2.95 ; -5.8,2.55 -6.3,2.55 ; -2.6,-2.95 -2.1,-2.95 ; -2.6,2.55 -2.1,2.55 ; -2.1,-3.45 -2.1,-2.95 ; -2.1,-2.45 -2.1,-2.95 ; -2.1,2.05 -2.1,2.55 ; -2.1,3.05 -2.1,2.55 ; -1.6,-2.95 -2.1,-2.95 ; -1.6,2.55 -2.1,2.55 ; -0.5,0 0,0 ; 0,-0.5 0,0 ; 0,0.5 0,0 ; 0.5,0 0,0 ; 1.6,-2.95 2.1,-2.95 ; 1.6,2.55 2.1,2.55 ; 2.1,-3.45 2.1,-2.95 ; 2.1,-2.45 2.1,-2.95 ; 2.1,2.05 2.1,2.55 ; 2.1,3.05 2.1,2.55 ; 2.6,-2.95 2.1,-2.95 ; 2.6,2.55 2.1,2.55 ; 5.8,-2.95 6.3,-2.95 ; 5.8,2.55 6.3,2.55 ; 6.3,-3.45 6.3,-2.95 ; 6.3,-2.45 6.3,-2.95 ; 6.3,2.05 6.3,2.55 ; 6.3,3.05 6.3,2.55 ; 6.8,-2.95 6.3,-2.95 ; 6.8,2.55 6.3,2.55 ; 10,-2.95 10.5,-2.95 ; 10,2.55 10.5,2.55 ; 10.5,-3.45 10.5,-2.95 ; 10.5,-2.45 10.5,-2.95 ; 10.5,2.05 10.5,2.55 ; 10.5,3.05 10.5,2.55 ; 11,-2.95 10.5,-2.95 ; 11,2.55 10.5,2.55 ; 14.2,-2.95 14.7,-2.95 ; 14.2,2.55 14.7,2.55 ; 14.7,-3.45 14.7,-2.95 ; 14.7,-2.45 14.7,-2.95 ; 14.7,2.05 14.7,2.55 ; 14.7,3.05 14.7,2.55 ; 15.2,-2.95 14.7,-2.95 ; 15.2,2.55 14.7,2.55 ; 18.4,-2.95 18.9,-2.95 ; 18.4,2.55 18.9,2.55 ; 18.9,-3.45 18.9,-2.95 ; 18.9,-2.45 18.9,-2.95 ; 18.9,2.05 18.9,2.55 ; 18.9,3.05 18.9,2.55 ; 19.4,-2.95 18.9,-2.95 ; 19.4,2.55 18.9,2.55
Mechanical 14:
  drawing of 196 lines, arcs and shapes, not listed
  text "1" at -22.392,3.382 h1
  text "20" at 18.033,-6.418 h1
3D body "MOLEX_39-28-1203.stp": height 12.8, standoff -3.5, extent -22,-6.2 22,4.8

## MOLEX_39-29-1087 [mm] "4.20mm (.165\") Pitch Mini-Fit Jr. Header, Dual Row, Right Angle, with PCB Mounting Flange, 8 Circuits"
height 11.7
pads (10):
  round 2.5 hole 1.8: 1(-6.3,2.75) 2(-2.1,2.75) 3(2.1,2.75) 4(6.3,2.75) 5(-6.3,-2.75) 6(-2.1,-2.75) 7(2.1,-2.75) 8(6.3,-2.75)
  round 5.8 hole 3.2: 9(-10.8,6.95) 10(10.8,6.95)
Top Overlay:
  lines w0.2: -14,5.801 -14,3.85 -12.196,3.85 ; -14,8.099 -14,10.05 -12.196,10.05 ; -9.6,10.131 -9.6,14.65 -9.3,14.65 ; -9.404,3.85 -7.53,3.85 ; -9.404,10.05 -9,10.05 ; -9.4,10.05 -9.398,16.65 ; -9.4,16.65 9,16.65 9,9.834 ; -9,9.834 -9,16.65 ; -5.07,3.85 -3.33,3.85 ; -1.7,14.65 1.7,14.65 ; -1.7,16.65 -1.7,13.65 1.7,13.65 1.7,16.65 ; -0.87,3.85 0.87,3.85 ; 3.33,3.85 5.07,3.85 ; 7.53,3.85 9.404,3.85 ; 9,10.05 9.404,10.05 ; 9.05,14.65 9.6,14.65 9.6,10.131 ; 12.196,3.85 14,3.85 14,5.801 ; 12.196,10.05 14,10.05 14,8.099
  text "1" at -8.675,1.8 h1.2
  text "8" at 8.267,-3.425 h1.2
Mechanical 8:
  lines w0.1: -11.3,6.95 -10.8,6.95 ; -10.8,6.45 -10.8,6.95 ; -10.8,7.45 -10.8,6.95 ; -10.3,6.95 -10.8,6.95 ; -6.8,-2.75 -6.3,-2.75 ; -6.8,2.75 -6.3,2.75 ; -6.3,-3.25 -6.3,-2.75 ; -6.3,-2.25 -6.3,-2.75 ; -6.3,2.25 -6.3,2.75 ; -6.3,3.25 -6.3,2.75 ; -5.8,-2.75 -6.3,-2.75 ; -5.8,2.75 -6.3,2.75 ; -2.6,-2.75 -2.1,-2.75 ; -2.6,2.75 -2.1,2.75 ; -2.1,-3.25 -2.1,-2.75 ; -2.1,-2.25 -2.1,-2.75 ; -2.1,2.25 -2.1,2.75 ; -2.1,3.25 -2.1,2.75 ; -1.6,-2.75 -2.1,-2.75 ; -1.6,2.75 -2.1,2.75 ; -0.5,0 0,0 ; 0,-0.5 0,0 ; 0,0.5 0,0 ; 0.5,0 0,0 ; 1.6,-2.75 2.1,-2.75 ; 1.6,2.75 2.1,2.75 ; 2.1,-3.25 2.1,-2.75 ; 2.1,-2.25 2.1,-2.75 ; 2.1,2.25 2.1,2.75 ; 2.1,3.25 2.1,2.75 ; 2.6,-2.75 2.1,-2.75 ; 2.6,2.75 2.1,2.75 ; 5.8,-2.75 6.3,-2.75 ; 5.8,2.75 6.3,2.75 ; 6.3,-3.25 6.3,-2.75 ; 6.3,-2.25 6.3,-2.75 ; 6.3,2.25 6.3,2.75 ; 6.3,3.25 6.3,2.75 ; 6.8,-2.75 6.3,-2.75 ; 6.8,2.75 6.3,2.75 ; 10.3,6.95 10.8,6.95 ; 10.8,6.45 10.8,6.95 ; 10.8,7.45 10.8,6.95 ; 11.3,6.95 10.8,6.95
Mechanical 14:
  circle w0.1: c10.8,6.95 r1.2
  circle w0.1: c-10.8,6.95 r1.2
  lines w0.1: -12,6.95 -12,10.05 ; -9.6,6.95 -9.6,14.65 -9.3,14.65 ; -9.4,10.05 -9.398,16.65 ; -9.4,16.65 9,16.65 9,3.85 ; -9,3.85 -9,16.65 ; -9,10.05 -14,10.05 -14,3.85 14,3.85 14,10.05 9,10.05 ; -6.8,3.85 -6.8,-3.25 -5.8,-3.25 -5.8,3.85 ; -2.6,3.85 -2.6,-3.25 -1.6,-3.25 -1.6,3.85 ; -1.7,14.65 1.7,14.65 ; -1.7,16.65 -1.7,13.65 1.7,13.65 1.7,16.65 ; 1.6,3.85 1.6,-3.25 2.6,-3.25 2.6,3.85 ; 5.8,3.85 5.8,-3.25 6.8,-3.25 6.8,3.85 ; 9.05,14.65 9.6,14.65 9.6,6.95 ; 12,6.95 12,10.05
  text "1" at -8.675,1.8 h1.2
  text "8" at 8.267,-3.425 h1.2
3D body "MOLEX_39-29-1087.stp": height 11.4, standoff -3.5, extent -14,-3.25 14,16.65

## MOLEX_39-30-1080 [mm] "4.20mm (.165\") Pitch Mini-Fit Jr. Header, Dual Row, Right Angle with Snap-in Plastic Peg PCB Lock, 8 Circuits"
height 11.4
pads (10):
  round 2.5 hole 1.8: 1(-6.3,2.75) 2(-2.1,2.75) 3(2.1,2.75) 4(6.3,2.75) 5(-6.3,-2.75) 6(-2.1,-2.75) 7(2.1,-2.75) 8(6.3,-2.75)
  round 1 hole 3 unplated mask+1: 9(-6.3,10.05) 9(6.3,10.05)
Top Overlay:
  lines w0.2: -9,3.85 -9,16.65 ; -7.53,3.85 -9.4,3.85 -9.4,16.65 9,16.65 9,3.85 7.53,3.85 ; -6.835,-1.189 -6.835,1.189 ; -5.765,-1.189 -5.765,1.189 ; -5.07,3.85 -3.33,3.85 ; -2.635,-1.189 -2.635,1.189 ; -1.7,14.3 1.7,14.3 ; -1.7,16.65 -1.7,13.478 1.7,13.478 1.7,16.65 ; -1.565,-1.189 -1.565,1.189 ; -0.87,3.85 0.87,3.85 ; 1.565,-1.189 1.565,1.189 ; 2.635,-1.189 2.635,1.189 ; 3.33,3.85 5.07,3.85 ; 5.765,-1.189 5.765,1.189 ; 6.835,-1.189 6.835,1.189
  text "1" at -8.675,1.8 h1.2
  text "8" at 8.267,-3.425 h1.2
Mechanical 8:
  lines w0.1: -6.8,-2.75 -6.3,-2.75 ; -6.8,2.75 -6.3,2.75 ; -6.8,10.05 -6.3,10.05 ; -6.3,-3.25 -6.3,-2.75 ; -6.3,-2.25 -6.3,-2.75 ; -6.3,2.25 -6.3,2.75 ; -6.3,3.25 -6.3,2.75 ; -6.3,9.55 -6.3,10.05 ; -6.3,10.55 -6.3,10.05 ; -5.8,-2.75 -6.3,-2.75 ; -5.8,2.75 -6.3,2.75 ; -5.8,10.05 -6.3,10.05 ; -2.6,-2.75 -2.1,-2.75 ; -2.6,2.75 -2.1,2.75 ; -2.1,-3.25 -2.1,-2.75 ; -2.1,-2.25 -2.1,-2.75 ; -2.1,2.25 -2.1,2.75 ; -2.1,3.25 -2.1,2.75 ; -1.6,-2.75 -2.1,-2.75 ; -1.6,2.75 -2.1,2.75 ; -0.5,0 0,0 ; 0,-0.5 0,0 ; 0,0.5 0,0 ; 0.5,0 0,0 ; 1.6,-2.75 2.1,-2.75 ; 1.6,2.75 2.1,2.75 ; 2.1,-3.25 2.1,-2.75 ; 2.1,-2.25 2.1,-2.75 ; 2.1,2.25 2.1,2.75 ; 2.1,3.25 2.1,2.75 ; 2.6,-2.75 2.1,-2.75 ; 2.6,2.75 2.1,2.75 ; 5.8,-2.75 6.3,-2.75 ; 5.8,2.75 6.3,2.75 ; 5.8,10.05 6.3,10.05 ; 6.3,-3.25 6.3,-2.75 ; 6.3,-2.25 6.3,-2.75 ; 6.3,2.25 6.3,2.75 ; 6.3,3.25 6.3,2.75 ; 6.3,9.55 6.3,10.05 ; 6.3,10.55 6.3,10.05 ; 6.8,-2.75 6.3,-2.75 ; 6.8,2.75 6.3,2.75 ; 6.8,10.05 6.3,10.05
Mechanical 14:
  lines w0.1: -9,3.85 -9,16.65 ; -6.835,3.85 -6.835,-3.285 -5.765,-3.285 -5.765,3.85 ; -2.635,3.85 -2.635,-3.285 -1.565,-3.285 -1.565,3.85 ; -1.7,14.3 1.7,14.3 ; -1.7,16.65 -1.7,13.478 1.7,13.478 1.7,16.65 ; 1.565,3.85 1.565,-3.285 2.635,-3.285 2.635,3.85 ; 5.765,3.85 5.765,-3.285 6.835,-3.285 6.835,3.85 ; -9.4,3.85 -9.4,16.65 9,16.65 9,3.85 -9.4,3.85
  text "1" at -8.675,1.8 h1.2
  text "8" at 8.267,-3.425 h1.2
3D body "MOLEX_39-30-1080.stp": height 11.4, standoff -3.6, extent -9.4,-3.285 9,16.65